# Altium footprint library PBL - THD Packages.PcbLib: 256 footprints (part 5 of 16)
Each footprint in its own frame and in the unit in brackets; x right, y up, seen from the top. Pads: shape width x height; smd on the part's side, far side on the other; paste and mask are expansions set on the pad; w line width, h text height; cw(c..) or ccw(c..) is an arc to the next point about the centre after c.
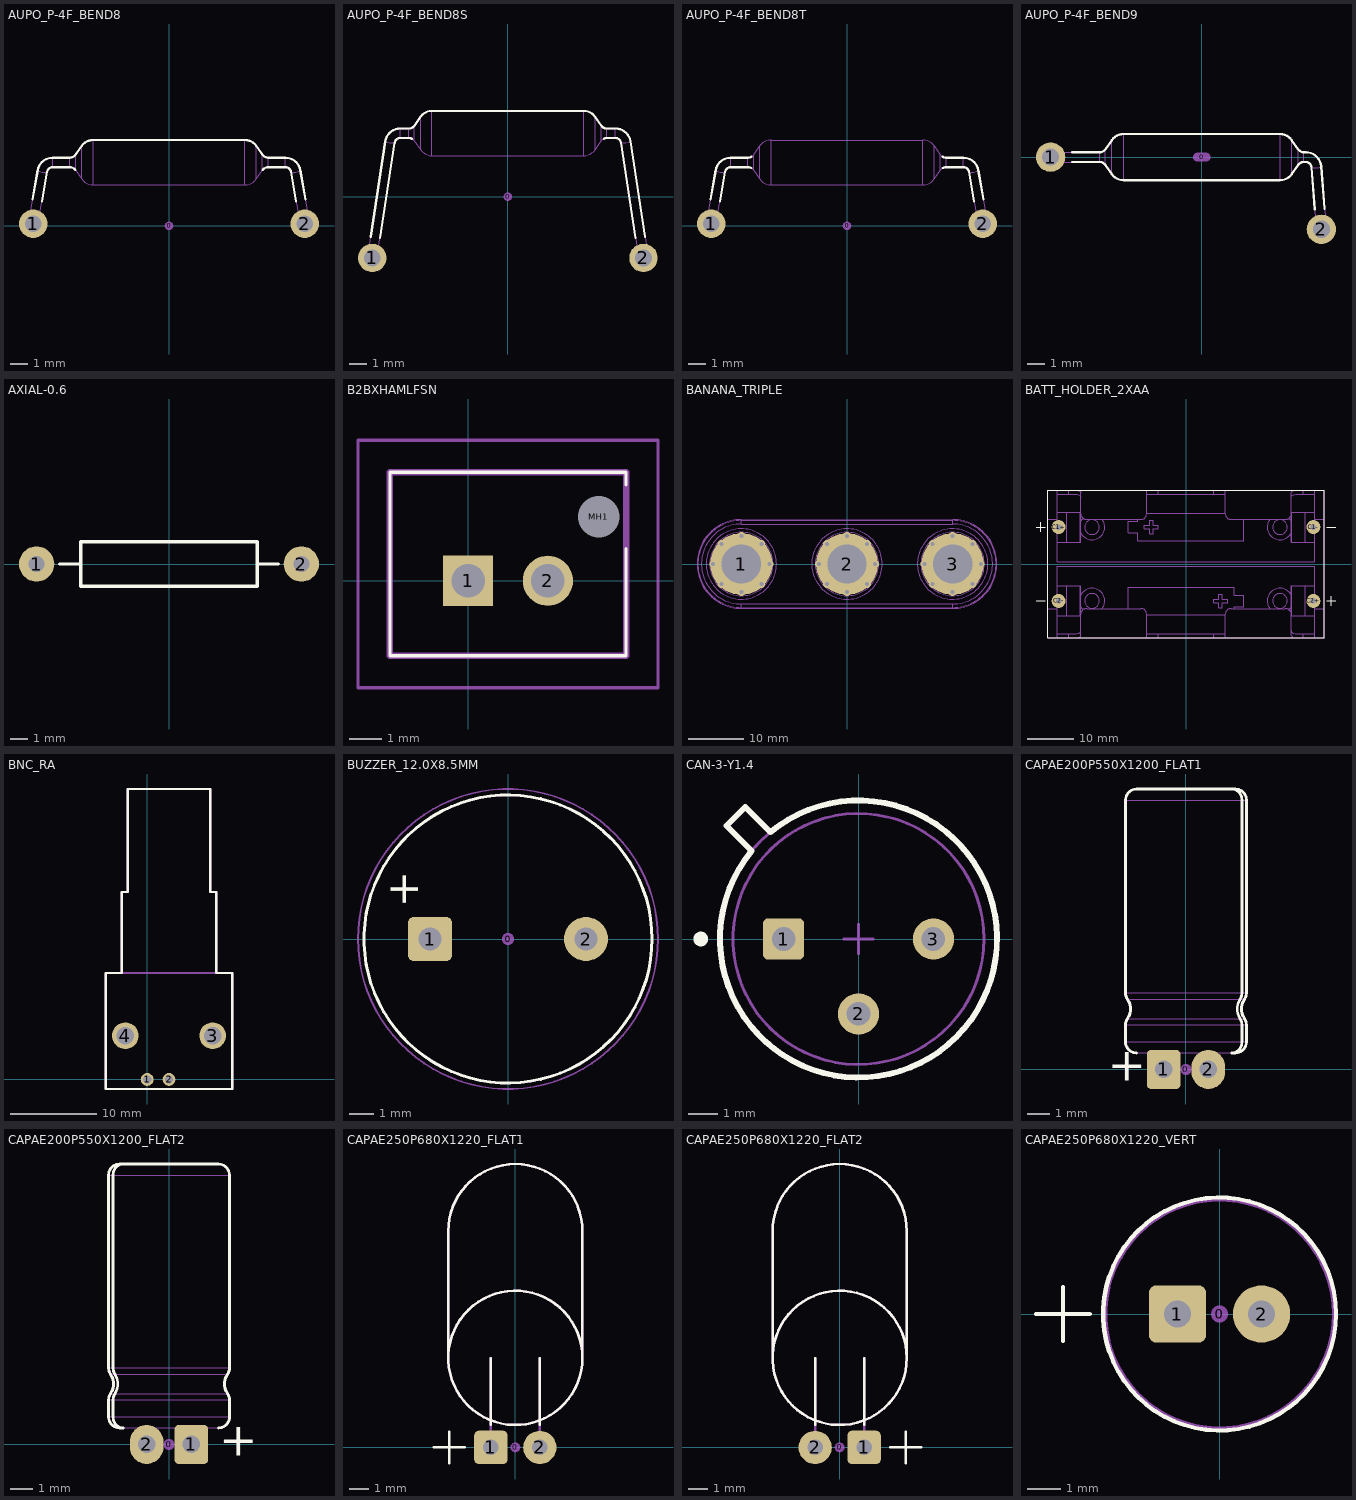
[diagram p4: the footprints below, top view; thin cyan lines are the x and y axes]

## AUPO_P-4F_BEND8 [mil] "Aupo P-4F TCO for positioning on IC legs"
height 100
pads (3):
  round 19.68 on Mech15: 0(0,0)
  round 65 / inner round 65 / far side round 90 hole 38: 1(-310,5) 2(310,5)
Top Overlay:
  lines w5: -311.41,60.24 -299.71,127.69 cw(c-266,121.56) -265.75,155.83 -226.38,155.83 ccw(c-226.38,171.57) -213.48,162.54 -199.33,182.75 cw(c-173.53,164.69) -173.53,196.18 173.53,196.18 cw(c173.53,164.69) 199.33,182.75 213.48,162.54 ccw(c226.38,171.57) 226.38,155.83 265.75,155.83 cw(c265.99,121.56) 299.71,127.69 311.41,60.24 ; -290.07,56.54 -278.37,123.99 cw(c-265.97,121.53) -265.75,134.17 -226.38,134.17 cw(c-226.38,118.43) -213.48,127.46 ; 213.48,127.46 cw(c226.38,118.43) 226.38,134.17 265.75,134.17 cw(c266,121.57) 278.37,123.99 290.07,56.54
13 - 3D Top Side:
  lines w1.97: -317.54,24.86 -317.55,24.7 -317.24,24.12 -316.45,23.48 -315.22,22.83 -313.59,22.18 -311.65,21.57 -309.48,21.03 -307.2,20.58 -304.9,20.24 -302.69,20.03 -300.67,19.97 -298.95,20.04 -297.6,20.25 -296.68,20.6 -296.24,21.05 -296.21,21.16 ; -299.62,127.25 ccw(c-286.09,144.54) -278.37,123.99 ; 296.21,21.16 ccw(c303.94,41.66) 317.46,24.42 317.54,24.86 ; 299.62,127.25 cw(c286.09,144.54) 278.37,123.99 ; -278.37,123.99 cw(c-265.97,121.53) -265.75,134.17 ; -278.37,123.99 -299.33,3.15 cw(c-310,5) -320.67,6.85 -299.71,127.69 cw(c-266,121.56) -265.75,155.83 ; -265.75,134.17 -265.75,155.83 ; -265.75,134.17 -226.38,134.17 ; -265.75,155.83 -226.38,155.83 ; -226.38,134.17 cw(c-226.38,118.43) -213.48,127.46 ; -226.38,134.17 -226.38,155.83 ; -226.38,155.83 ccw(c-226.38,171.57) -213.48,162.54 ; -213.48,127.46 -213.48,162.54 ; -213.48,127.46 -199.33,107.25 ; -213.48,162.54 -199.33,182.75 ; -199.33,107.25 ccw(c-173.53,125.31) -173.53,93.82 ; -199.33,107.25 -199.33,182.75 ; -199.33,182.75 cw(c-173.53,164.69) -173.53,196.18 ; -173.53,93.82 -173.53,196.18 ; -173.53,93.82 173.53,93.82 ; -173.53,196.18 173.53,196.18 ; 173.53,93.82 ccw(c173.53,125.31) 199.33,107.25 ; 173.53,93.82 173.53,196.18 ; 173.53,196.18 cw(c173.53,164.69) 199.33,182.75 ; 199.33,107.25 199.33,182.75 ; 199.33,107.25 213.48,127.46 ; 199.33,182.75 213.48,162.54 ; 213.48,127.46 cw(c226.38,118.43) 226.38,134.17 ; 213.48,127.46 213.48,162.54 ; 213.48,162.54 ccw(c226.38,171.57) 226.38,155.83 ; 226.38,134.17 226.38,155.83 ; 226.38,134.17 265.75,134.17 ; 226.38,155.83 265.75,155.83 ; 265.75,134.17 cw(c266,121.57) 278.37,123.99 ; 265.75,134.17 265.75,155.83 ; 265.75,155.83 cw(c265.99,121.56) 299.71,127.69 320.67,6.85 320.83,5 cw(c310,5) 299.33,3.15 278.37,123.99
3D body "TH pad - 20 pin x 90.STEP": height 40, standoff 0, extent 265.36,-39.9 355,49.92
3D body "AUPO P-4F BEND8.STEP": height 104.95, standoff -98, extent -320.74,-5.8 320.83,196.09
3D body "TH pad - 20 pin x 90.STEP": height 40, standoff 0, extent -354.64,-39.9 -265,49.92

## AUPO_P-4F_BEND8S [mil] "Aupo P-4F TCO for positioning beside FETs"
height 133.86
pads (3):
  round 19.68 on Mech15: 0(0,0)
  round 65 / inner round 65 / far side round 90 hole 38: 1(-310,-140) 2(310,-140)
Top Overlay:
  lines w5: -313.51,-91.4 -280.12,126.69 cw(c-246.12,121.42) -246.06,155.83 -226.38,155.83 ccw(c-226.38,171.57) -213.48,162.54 -199.33,182.75 cw(c-173.53,164.69) -173.53,196.18 173.53,196.18 cw(c173.53,164.69) 199.33,182.75 213.48,162.54 ccw(c226.38,171.57) 226.38,155.83 246.06,155.83 cw(c246.12,121.42) 280.12,126.69 313.51,-91.4 ; -292.11,-94.68 -258.71,123.41 cw(c-246.11,121.41) -246.06,134.17 -226.38,134.17 cw(c-226.38,118.43) -219.72,132.7 ; 219.72,132.7 cw(c226.38,118.43) 226.38,134.17 246.06,134.17 cw(c246.11,121.41) 258.71,123.41 292.11,-94.68
13 - 3D Top Side:
  lines w1.97: -317.5,-117.47 ccw(c-301.1,-81.89) -296.1,-120.75 ; 296.1,-120.75 ccw(c300.88,-78.69) 317.41,-117.66 317.5,-117.47 ; -280.12,126.69 ccw(c-263.71,162.32) -258.71,123.41 ; -280.12,126.69 cw(c-246.12,121.42) -246.06,155.83 ; -280.12,126.69 -320.7,-138.36 ccw(c-310,-140) -299.3,-141.64 -258.71,123.41 ; -258.71,123.41 cw(c-246.11,121.41) -246.06,134.17 ; -246.06,134.17 -246.06,155.83 ; -246.06,134.17 -226.38,134.17 ; -246.06,155.83 -226.38,155.83 ; -226.38,134.17 cw(c-226.38,118.43) -213.48,127.46 ; -226.38,134.17 -226.38,155.83 ; -226.38,155.83 ccw(c-226.38,171.57) -213.48,162.54 ; -213.48,127.46 -213.48,162.54 ; -213.48,127.46 -199.33,107.25 ; -213.48,162.54 -199.33,182.75 ; -199.33,107.25 ccw(c-173.53,125.31) -173.53,93.82 ; -199.33,107.25 -199.33,182.75 ; -199.33,182.75 cw(c-173.53,164.69) -173.53,196.18 ; -173.53,93.82 -173.53,196.18 ; -173.53,93.82 173.53,93.82 ; -173.53,196.18 173.53,196.18 ; 173.53,93.82 ccw(c173.53,125.31) 199.33,107.25 ; 173.53,93.82 173.53,196.18 ; 173.53,196.18 cw(c173.53,164.69) 199.33,182.75 ; 199.33,107.25 199.33,182.75 ; 199.33,107.25 213.48,127.46 ; 199.33,182.75 213.48,162.54 ; 213.48,127.46 cw(c226.38,118.43) 226.38,134.17 ; 213.48,127.46 213.48,162.54 ; 213.48,162.54 ccw(c226.38,171.57) 226.38,155.83 ; 226.38,134.17 226.38,155.83 ; 226.38,134.17 246.06,134.17 ; 226.38,155.83 246.06,155.83 ; 246.06,134.17 cw(c246.12,121.43) 258.71,123.41 ; 246.06,134.17 246.06,155.83 ; 246.06,155.83 cw(c246.12,121.42) 280.12,126.69 ; 258.71,123.41 ccw(c263.49,165.49) 280.02,126.5 280.12,126.69 ; 258.71,123.41 299.3,-141.64 ccw(c310,-140) 320.83,-140 320.7,-138.36 280.12,126.69
3D body "TH pad - 20 pin x 90.STEP": height 40, standoff 0, extent -354.64,-184.9 -265,-95.08
3D body "AUPO P-4F BEND8S.STEP": height 102.95, standoff -100, extent -320.74,-150.8 320.83,196.09
3D body "TH pad - 20 pin x 90.STEP": height 40, standoff 0, extent 265.36,-184.9 355,-95.08

## AUPO_P-4F_BEND8T [mil] "Aupo P-4F TCO for positioning on top of FETs"
height 133.86
pads (3):
  round 19.68 on Mech15: 0(0,0)
  round 65 / inner round 65 / far side round 90 hole 38: 1(-310,5) 2(310,5)
Top Overlay:
  lines w5: -311.41,60.24 -299.71,127.69 cw(c-266,121.56) -265.75,155.83 -226.38,155.83 ccw(c-226.38,171.57) -218.5,157.94 ; -290.07,56.54 -278.37,123.99 cw(c-265.97,121.53) -265.75,134.17 -226.38,134.17 cw(c-226.38,118.43) -218.5,132.06 ; 218.5,132.06 cw(c226.38,118.43) 226.38,134.17 265.75,134.17 cw(c266,121.57) 278.37,123.99 290.07,56.54 ; 218.5,157.94 ccw(c226.38,171.57) 226.38,155.83 265.75,155.83 cw(c265.99,121.56) 299.71,127.69 311.41,60.24
13 - 3D Top Side:
  lines w1.97: -317.54,24.86 -317.55,24.7 -317.24,24.12 -316.45,23.48 -315.22,22.83 -313.59,22.18 -311.65,21.57 -309.48,21.03 -307.2,20.58 -304.9,20.24 -302.69,20.03 -300.67,19.97 -298.95,20.04 -297.6,20.25 -296.68,20.6 -296.24,21.05 -296.21,21.16 ; -299.62,127.25 ccw(c-286.09,144.54) -278.37,123.99 ; 296.21,21.16 ccw(c303.94,41.66) 317.46,24.42 317.54,24.86 ; 299.62,127.25 cw(c286.09,144.54) 278.37,123.99 ; -278.37,123.99 cw(c-265.97,121.53) -265.75,134.17 ; -278.37,123.99 -299.33,3.15 cw(c-310,5) -320.67,6.85 -299.71,127.69 cw(c-266,121.56) -265.75,155.83 ; -265.75,134.17 -226.38,134.17 ; -265.75,134.17 -265.75,155.83 ; -265.75,155.83 -226.38,155.83 ; -226.38,134.17 cw(c-226.38,118.43) -213.48,127.46 ; -226.38,134.17 -226.38,155.83 ; -226.38,155.83 ccw(c-226.38,171.57) -213.48,162.54 ; -213.48,127.46 -199.33,107.25 ; -213.48,127.46 -213.48,162.54 ; -213.48,162.54 -199.33,182.75 ; -199.33,107.25 ccw(c-173.53,125.31) -173.53,93.82 ; -199.33,107.25 -199.33,182.75 ; -199.33,182.75 cw(c-173.53,164.69) -173.53,196.18 ; -173.53,93.82 173.53,93.82 ; -173.53,93.82 -173.53,196.18 ; -173.53,196.18 173.53,196.18 ; 173.53,93.82 ccw(c173.53,125.31) 199.33,107.25 ; 173.53,93.82 173.53,196.18 ; 173.53,196.18 cw(c173.53,164.69) 199.33,182.75 ; 199.33,107.25 213.48,127.46 ; 199.33,107.25 199.33,182.75 ; 199.33,182.75 213.48,162.54 ; 213.48,127.46 cw(c226.38,118.43) 226.38,134.17 ; 213.48,127.46 213.48,162.54 ; 213.48,162.54 ccw(c226.38,171.57) 226.38,155.83 ; 226.38,134.17 265.75,134.17 ; 226.38,134.17 226.38,155.83 ; 226.38,155.83 265.75,155.83 ; 265.75,134.17 cw(c266,121.57) 278.37,123.99 ; 265.75,134.17 265.75,155.83 ; 265.75,155.83 cw(c265.99,121.56) 299.71,127.69 320.67,6.85 320.83,5 cw(c310,5) 299.33,3.15 278.37,123.99
3D body "TH pad - 20 pin x 90.STEP": height 40, standoff 0, extent -354.64,-39.9 -265,49.92
3D body "AUPO P-4F BEND8.STEP": height 136.81, standoff -66.14, extent -320.74,-5.8 320.83,196.09
3D body "TH pad - 20 pin x 90.STEP": height 40, standoff 0, extent 265.36,-39.9 355,49.92

## AUPO_P-4F_BEND9 [mil] "Aupo P-4F TCO for positioning on IC legs"
height 100
pads (3):
  oval 39.37x19.68 on Mech15: 0(0,0)
  round 65 / inner round 65 / far side round 90 hole 38: 1(-335,0) 2(265,-160)
Top Overlay:
  lines w5: -287.4,-10.83 -226.38,-10.83 cw(c-226.38,-26.57) -213.48,-17.54 -199.33,-37.75 ccw(c-173.53,-19.69) -173.53,-51.18 173.53,-51.18 ccw(c173.53,-19.68) 199.33,-37.75 213.48,-17.54 cw(c226.38,-26.57) 226.38,-10.83 230.32,-10.83 cw(c230.52,-23.44) 243.07,-22.2 250.57,-115.9 ; -287.4,10.83 -226.38,10.83 ccw(c-226.38,26.57) -213.48,17.54 -199.33,37.75 cw(c-173.53,19.68) -173.53,51.18 173.53,51.18 cw(c173.53,19.68) 199.33,37.75 213.48,17.54 ccw(c226.38,26.57) 226.38,10.83 230.32,10.83 cw(c230.53,-23.43) 264.66,-20.48 ; 264.64,-20.65 264.66,-20.48 ; 272.15,-114.17 264.66,-20.48
13 - 3D Top Side:
  lines w1.97: 252.66,-141.98 ccw(c261.89,-119.69) 274.22,-140.43 274.24,-140.26 ; -226.38,-10.83 cw(c-226.38,-26.57) -213.48,-17.54 ; -226.38,-10.83 -226.38,10.83 ; -226.38,-10.83 -335,-10.83 cw(c-335,0) -335,10.83 -226.38,10.83 ; -226.38,10.83 ccw(c-226.38,26.57) -213.48,17.54 ; -213.48,-17.54 -213.48,17.54 ; -213.48,-17.54 -199.33,-37.75 ; -213.48,17.54 -199.33,37.75 ; -199.33,-37.75 ccw(c-173.53,-19.69) -173.53,-51.18 ; -199.33,-37.75 -199.33,37.75 ; -199.33,37.75 cw(c-173.53,19.68) -173.53,51.18 ; -173.53,-51.18 -173.53,51.18 ; -173.53,-51.18 173.53,-51.18 ; -173.53,51.18 173.53,51.18 ; 173.53,-51.18 ccw(c173.53,-19.68) 199.33,-37.75 ; 173.53,-51.18 173.53,51.18 ; 173.53,51.18 cw(c173.53,19.68) 199.33,37.75 ; 199.33,-37.75 199.33,37.75 ; 199.33,-37.75 213.48,-17.54 ; 199.33,37.75 213.48,17.54 ; 213.48,-17.54 cw(c226.38,-26.57) 226.38,-10.83 ; 213.48,-17.54 213.48,17.54 ; 213.48,17.54 ccw(c226.38,26.57) 226.38,10.83 ; 226.38,-10.83 226.38,10.83 ; 226.38,-10.83 230.32,-10.83 cw(c230.52,-23.44) 243.07,-22.2 ; 226.38,10.83 230.32,10.83 cw(c230.53,-23.43) 264.66,-20.48 ; 243.07,-22.2 ccw(c252.3,0.13) 264.64,-20.65 264.66,-20.48 ; 243.07,-22.2 254.17,-160.86 ccw(c264.96,-160) 275.79,-160 275.75,-159.14 264.66,-20.48
3D body "AUPO_P-4F_BEND9.STEP": height 102.95, standoff -100, extent -345.74,-170.8 275.79,51.08
3D body "TH pad - 20 pin x 90.STEP": height 40, standoff 0, extent 220.36,-204.9 310,-115.08
3D body "TH pad - 20 pin x 90.STEP": height 40, standoff 0, extent -379.64,-44.9 -289.99,44.92

## AXIAL-0.6 [mil] "Axial Device, Thru-Hole; 2 Leads; 0.6 in Pin Spacing"
height 100
pads (2):
  round 80 hole 36: 1(-300,0) 2(300,0)
Top Overlay:
  lines w7.87: -248.03,0 -200,0 ; 200,0 248.03,0 ; -200,-50 200,-50 200,50 -200,50 -200,-50
3D body "Res_Axial_0.6.STEP": height 102.76, standoff -98.43, extent -311.8,-51.57 311.82,51.58

## B2BXHAMLFSN [mm]
pads (3):
  rect 1.575x1.575 hole 1.05: 1(0,0)
  round 1.575 hole 1.05: 2(2.5,0)
  round 0.65 hole 1.3 unplated: MH1(4.1,2)
Top Overlay:
  lines w0.1: -2.45,-2.35 -2.45,3.4 ; -2.45,-2.35 -2.45,3.4 ; -2.45,-2.35 4.95,-2.35 ; -2.45,-2.35 4.95,-2.35 ; -2.45,3.4 4.95,3.4 ; -2.45,3.4 4.95,3.4 ; 4.95,-2.35 4.95,1 4.95,-2.35 ; 4.95,3.4 4.95,3 4.95,3.4
13 - 3D Top Side:
  lines w0.2: -2.45,-2.35 4.95,-2.35 4.95,3.4 -2.45,3.4 -2.45,-2.35
15 - Top Courtyards:
  lines w0.1: -3.45,-3.35 5.95,-3.35 5.95,4.4 -3.45,4.4 -3.45,-3.35
3D body "B2B-XH-AM_LF__SN_.stp": height 7, standoff -3.4, extent -2.491,-2.405 4.909,3.345

## BANANA_TRIPLE [mil] "Triple Banana jack, panel mount style"
height 318.9
pads (3):
  round 440 hole 280: 1(-750,0) 2(0,0) 3(750,0)
via 750,200 diameter 56 hole 28
via 608.58,141.42 diameter 56 hole 28
via 550,0 diameter 56 hole 28
via 608.58,-141.42 diameter 56 hole 28
via 750,-200 diameter 56 hole 28
via 891.42,-141.42 diameter 56 hole 28
via 950,0 diameter 56 hole 28
via 891.42,141.42 diameter 56 hole 28
via -750,200 diameter 56 hole 28
via -891.42,141.42 diameter 56 hole 28
via -950,0 diameter 56 hole 28
via -891.42,-141.42 diameter 56 hole 28
via -750,-200 diameter 56 hole 28
via -608.58,-141.42 diameter 56 hole 28
via -550,0 diameter 56 hole 28
via -608.58,141.42 diameter 56 hole 28
via 141.42,141.42 diameter 56 hole 28
via 200,0 diameter 56 hole 28
via 141.42,-141.42 diameter 56 hole 28
via 0,-200 diameter 56 hole 28
via -141.42,-141.42 diameter 56 hole 28
via -200,0 diameter 56 hole 28
via -141.42,141.42 diameter 56 hole 28
via 0,200 diameter 56 hole 28
13 - 3D Top Side:
  circle w5: c750,0 r250
  circle w5: c750,0 r83
  circle w5: c750,0 r225
  circle w5: c0,0 r250
  circle w5: c-750,0 r83
  circle w5: c0,0 r83
  circle w5: c0,0 r225
  circle w5: c-750,0 r225
  circle w5: c-750,0 r250
  lines w5: -750,-315 cw(c-750,0) -750,315 ; -750,-315 750,-315 ; -750,-315 -750,-283.94 ; -750,-283.94 cw(c-750,0) -750,283.94 ; -750,-283.94 750,-283.94 ; -750,283.94 -750,315 ; -750,283.94 750,283.94 ; -750,315 750,315 ; 750,-315 ccw(c750,0) 750,315 ; 750,-315 750,-283.94 ; 750,-283.94 ccw(c750,0) 750,283.94 ; 750,283.94 750,315 ; -750,-308.9 cw(c-750,0) -750,308.9 750,308.9 cw(c750,0) 750,-308.9 -750,-308.9
3D body "Banana Jack Triple.STEP": height 380, standoff -840, extent -1064.99,-314.99 1065,315

## BATT_HOLDER_2XAA [mil] "2-cell AA battery holder"
height 660
pads (4):
  round 120 hole 48: C1+(-1086.61,314.96) C1-(1086.61,314.96) C2+(1086.61,-314.96) C2-(-1086.61,-314.96)
Top Overlay:
  lines w5: -1279.53,-314.96 -1200.79,-314.96 ; -1279.53,314.96 -1200.79,314.96 ; -1240.16,275.59 -1240.16,354.33 ; 1200.79,-314.96 1279.53,-314.96 ; 1200.79,314.96 1279.53,314.96 ; 1240.16,-354.33 1240.16,-275.59
  lines w7.87: -1181.1,-629.92 1181.1,-629.92 1181.1,629.92 -1181.1,629.92 -1181.1,-629.92
13 - 3D Top Side:
  drawing of 198 lines, arcs and shapes, not listed
3D body "2xAA Battery Holder.STEP": height 657.48, standoff -118.11, extent -1181.1,-629.91 1181.1,629.93

## BNC_RA [mm] "Right Angle BNC connector"
pads (4):
  round 1.5 hole 0.97: 1(0,0) 2(2.54,0)
  round 3.1 hole 2.06: 3(7.62,5.088) 4(-2.54,5.088)
Top Overlay:
  lines w0.254: -4.81,-1.112 9.89,-1.112 9.89,12.388 8.04,12.388 8.04,21.788 7.34,21.788 7.34,33.788 -2.26,33.788 -2.26,21.788 -2.96,21.788 -2.96,12.388 -4.81,12.388 -4.81,-1.112
Top Assembly:
  lines w0.254: -2.96,12.388 -2.96,21.788 -2.26,21.788 -2.26,33.788 7.34,33.788 7.34,21.788 8.04,21.788 8.04,12.388 ; -4.81,-1.112 -4.81,12.388 9.89,12.388 9.89,-1.112 -4.81,-1.112
3D body "1-1337543-0.stp": height 15.62, standoff -4.48, extent -4.7,-2.192 10,33.308

## BUZZER_12.0X8.5MM [mil]
height 354.33
pads (3):
  round 20 on Mech15: 0(0,0)
  rrect25% 72x72 / inner rrect25% 72x72 / far side rrect25% 90x90 hole 38: 1(-127.95,0)
  round 72 / inner round 72 / far side round 90 hole 38: 2(127.95,0)
Top Overlay:
  circle w5: c0,0 r236.22
  text "+" at -129.92,51.18 h90
13 - 3D Top Side:
  circle w3: c0.14,-0.47 r236.22
15 - Top Courtyards:
  circle w3: c0,0 r246.06
3D body "TH pad - 28 pin x 90.STEP": height 50, standoff 0, extent -172.59,-44.91 -82.95,44.92
3D body "TH pad - 28 pin x 90.STEP": height 50, standoff 0, extent 83.31,-44.9 172.96,44.92
3D body "3100-xxx speaker 8.5mm.STEP": height 354.33, standoff -110.24, extent -246.02,-246.04 246.07,246.06

## CAN-3-Y1.4 [mm] "Can; 3 Leads; Pin Circle Dia. 5.08 mm; Lead Dia. 0.48 mm (max)"
height 4.55
pads (3):
  rrect25% 1.4x1.4 hole 0.8: 1(-2.54,0)
  round 1.4 hole 0.8: 2(0,-2.54) 3(2.54,0)
Top Overlay:
  circle w0.25: c-5.35,0 r0.125
  lines w0.2: -3.626,2.99 -4.475,3.838 -3.838,4.475 -2.99,3.626 ; -3.622,2.987 ccw(c0,0) -2.987,3.622
13 - 3D Top Side:
  circle w0.1: c0,0 r4.695
  circle w0.1: c0,0 r4.255
15 - Top Courtyards:
  lines w0.1: -0.5,0 0.5,0 ; 0,-0.5 0,0.5
3D body: height 1.27, standoff 0, extent -4.694,-4.694 4.694,4.694
3D body: height 4.55, standoff 1.27, extent -4.254,-4.254 4.254,4.254

## CAPAE200P550X1200_FLAT1 [mil]
height 216.54
pads (3):
  round 20 on Mech15: 0(0,0)
  rrect25% 60x70 hole 31.5: 1(-40,0)
  oval 60x70 hole 31.5: 2(40,0)
Top Overlay:
  lines w5: -88.58,29.53 cw(c-88.58,49.25) -108.31,49.25 -108.31,79.64 cw(c-88.58,79.64) -104.79,90.88 ccw(c-129.92,108.31) -104.79,125.74 cw(c-88.58,136.98) -108.31,136.98 -108.31,482.32 cw(c-88.58,482.32) -88.58,502.05 81.84,502.05 cw(c81.06,483.05) 100.06,482.32 100.06,136.98 cw(c79.2,136.92) 96.81,125.74 ccw(c124.34,108.31) 96.81,90.88 cw(c79.2,79.7) 100.06,79.64 100.06,49.25 cw(c81.06,48.53) 81.84,29.53 ; 82.99,29.57 88.58,29.57 ccw(c88.58,49.25) 108.27,49.25 108.27,79.64 ccw(c88.58,79.64) 104.76,90.86 cw(c129.92,108.31) 104.76,125.76 ccw(c88.58,136.98) 108.27,136.98 108.27,482.32 ccw(c88.58,482.32) 88.58,502.01 82.99,502.01
  text "+" at -140,-20 h60
13 - 3D Top Side:
  lines w1.97: -49.21,19.68 -29.53,19.68 ; -49.21,29.53 -49.21,0 ccw(c-39.37,0) -29.53,0 -29.53,29.53 ; 29.53,19.68 49.21,19.68 ; 29.53,29.53 29.53,0 ccw(c39.37,0) 49.21,0 49.21,29.53 ; 82.99,29.57 88.58,29.57 ccw(c88.58,49.25) 108.27,49.25 ; 82.99,502.01 88.58,502.01 cw(c88.58,482.32) 108.27,482.32 ; -108.31,49.25 ccw(c-88.58,49.25) -88.58,29.53 81.84,29.53 ccw(c81.06,48.53) 100.06,49.25 100.06,79.64 ccw(c79.2,79.7) 96.81,90.88 ; -108.31,49.25 108.27,49.25 ; -108.31,49.25 -108.31,79.64 ; -108.31,79.64 cw(c-88.58,79.64) -104.79,90.88 ; -108.31,79.64 108.27,79.64 ; -108.31,136.98 ccw(c-88.58,136.98) -104.79,125.74 ; -108.31,136.98 108.27,136.98 ; -108.31,136.98 -108.31,482.32 ; -108.31,482.32 cw(c-88.58,482.32) -88.58,502.05 81.84,502.05 cw(c81.06,483.05) 100.06,482.32 100.06,136.98 cw(c79.2,136.92) 96.81,125.74 ; -108.31,482.32 108.27,482.32 ; -104.79,90.88 ccw(c-129.92,108.31) -104.79,125.74 ; -104.79,90.88 96.81,90.88 ; -104.79,125.74 96.81,125.74 ; 96.81,90.88 cw(c124.34,108.31) 96.81,125.74 ; 96.81,90.88 104.76,90.86 ; 96.81,125.74 104.76,125.76 ; 104.76,90.86 cw(c129.92,108.31) 104.76,125.76 ; 104.76,90.86 cw(c88.58,79.64) 108.27,79.64 ; 104.76,125.76 ccw(c88.58,136.98) 108.27,136.98 ; 108.27,49.25 108.27,79.64 ; 108.27,136.98 108.27,482.32
3D body "CAPAE200P550X1200_FLAT1.STEP": height 215.69, standoff -70, extent -107.37,-9.82 107.35,502.05

## CAPAE200P550X1200_FLAT2 [mil]
height 216.54
pads (3):
  round 20 on Mech15: 0(0,0)
  rrect25% 60x70 hole 31.5: 1(40,0)
  oval 60x70 hole 31.5: 2(-40,0)
Top Overlay:
  lines w5: -82.99,29.57 -88.58,29.57 cw(c-88.58,49.25) -108.27,49.25 -108.27,79.64 cw(c-88.58,79.64) -104.76,90.86 ccw(c-129.92,108.31) -104.76,125.76 cw(c-88.58,136.98) -108.27,136.98 -108.27,482.32 cw(c-88.58,482.32) -88.58,502.01 -82.99,502.01 ; -81.84,29.53 cw(c-81.06,48.53) -100.06,49.25 -100.06,79.64 cw(c-79.2,79.7) -96.81,90.88 ccw(c-124.34,108.31) -96.81,125.74 cw(c-79.2,136.92) -100.06,136.98 -100.06,482.32 cw(c-81.06,483.05) -81.84,502.05 88.58,502.05 cw(c88.58,482.32) 108.31,482.32 108.31,136.98 cw(c88.58,136.98) 104.79,125.74 ccw(c129.92,108.31) 104.79,90.88 cw(c88.58,79.64) 108.31,79.64 108.31,49.25 cw(c88.58,49.25) 88.58,29.53
  text "+" at 90,-20 h60
13 - 3D Top Side:
  lines w1.97: -82.99,29.57 -88.58,29.57 cw(c-88.58,49.25) -108.27,49.25 ; -82.99,502.01 -88.58,502.01 ccw(c-88.58,482.32) -108.27,482.32 ; -49.21,19.68 -29.53,19.68 ; -49.21,29.53 -49.21,0 ccw(c-39.37,0) -29.53,0 -29.53,29.53 ; 29.53,19.68 49.21,19.68 ; 29.53,29.53 29.53,0 ccw(c39.37,0) 49.21,0 49.21,29.53 ; -108.27,49.25 -108.27,79.64 ; -108.27,49.25 108.31,49.25 ; -108.27,79.64 cw(c-88.58,79.64) -104.76,90.86 ; -108.27,79.64 108.31,79.64 ; -108.27,136.98 ccw(c-88.58,136.98) -104.76,125.76 ; -108.27,136.98 -108.27,482.32 ; -108.27,136.98 108.31,136.98 ; -108.27,482.32 108.31,482.32 ; -104.76,90.86 ccw(c-129.92,108.31) -104.76,125.76 ; -104.76,90.86 -96.81,90.88 ; -104.76,125.76 -96.81,125.74 ; -96.81,90.88 ccw(c-79.2,79.7) -100.06,79.64 -100.06,49.25 ccw(c-81.06,48.53) -81.84,29.53 88.58,29.53 ccw(c88.58,49.25) 108.31,49.25 ; -96.81,90.88 ccw(c-124.34,108.31) -96.81,125.74 ; -96.81,90.88 104.79,90.88 ; -96.81,125.74 cw(c-79.2,136.92) -100.06,136.98 -100.06,482.32 cw(c-81.06,483.05) -81.84,502.05 88.58,502.05 cw(c88.58,482.32) 108.31,482.32 ; -96.81,125.74 104.79,125.74 ; 104.79,90.88 cw(c88.58,79.64) 108.31,79.64 ; 104.79,90.88 cw(c129.92,108.31) 104.79,125.74 ; 104.79,125.74 ccw(c88.58,136.98) 108.31,136.98 ; 108.31,49.25 108.31,79.64 ; 108.31,136.98 108.31,482.32
3D body "CAPAE200P550X1200_FLAT2.STEP": height 215.69, standoff -70, extent -107.33,-9.82 107.39,502.05

## CAPAE250P680X1220_FLAT1 [mm]
height 6.8
pads (3):
  round 0.508 on Mech15: 0(0,0)
  rrect25% 1.7x1.7 hole 0.8: 1(-1.25,0)
  round 1.7 hole 0.8: 2(1.25,0)
Top Overlay:
  circle w0.127: c0,4.572 r3.429
  lines w0.127: -4.18,0 -2.58,0 ; -3.429,4.572 -3.429,11.049 cw(c0,11.049) 3.429,11.049 3.429,4.572 ; -3.38,-0.8 -3.38,0.8 ; -1.25,1.143 -1.25,4.552 ; 1.25,1.143 1.25,4.552
13 - 3D Top Side:
  circle w0.127: c0,4.572 r3.429
  lines w0.127: -3.429,4.572 -3.429,11.049 cw(c0,11.049) 3.429,11.049 3.429,4.572 ; -1.25,0 -1.25,4.552 ; 1.25,0 1.25,4.552
3D body "CAPAE250P680X1220_FLAT1.STEP": height 6.77, standoff -1.78, extent -3.372,-0.249 3.371,12.952

## CAPAE250P680X1220_FLAT2 [mm]
height 6.8
pads (3):
  round 0.508 on Mech15: 0(0,0)
  rrect25% 1.7x1.7 hole 0.8: 1(1.25,0)
  round 1.7 hole 0.8: 2(-1.25,0)
Top Overlay:
  circle w0.127: c0,4.572 r3.429
  lines w0.127: -3.429,4.572 -3.429,11.049 cw(c0,11.049) 3.429,11.049 3.429,4.572 ; -1.25,1.143 -1.25,4.552 ; 1.25,1.143 1.25,4.552 ; 2.58,0 4.18,0 ; 3.38,-0.8 3.38,0.8
13 - 3D Top Side:
  circle w0.127: c0,4.572 r3.429
  lines w0.127: -3.429,4.572 -3.429,11.049 cw(c0,11.049) 3.429,11.049 3.429,4.572 ; -1.25,0 -1.25,4.552 ; 1.25,0 1.25,4.552
3D body "CAPAE250P680X1220_FLAT2.STEP": height 6.77, standoff -1.78, extent -3.371,-0.249 3.372,12.952

## CAPAE250P680X1220_VERT [mm]
height 12.2
pads (3):
  round 0.508 on Mech15: 0(0,0)
  rrect25% 1.7x1.7 hole 0.8: 1(-1.25,0)
  round 1.7 hole 0.8: 2(1.25,0)
Top Overlay:
  circle w0.127: c0,0 r3.459
  lines w0.127: -5.45,0 -3.85,0 ; -4.65,-0.8 -4.65,0.8
13 - 3D Top Side:
  circle w0.127: c0,0 r3.4
3D body "CAPAE250P680X1220_VERT.STEP": height 12.2, standoff -1.78, extent -3.372,-3.372 3.371,3.372